# Altium schematic symbol library Connector.SchLib: 394 symbols (part 3 of 4) (continued)
## DIN-6
designator *  value DIN-6  Reference: J
6-pin DIN connector; ki_keywords: circular DIN connector; ki_fp_filters: DIN*; Datasheet: http://www.mouser.com/ds/2/18/40_c091_abd_e-75918.pdf; Description_: 6-pin DIN connector
pins: 1, 2, 3, 4, 5, 6

## DIN-7
designator *  value DIN-7  Reference: J
7-pin DIN connector; ki_keywords: circular DIN connector; ki_fp_filters: DIN*; Datasheet: http://www.mouser.com/ds/2/18/40_c091_abd_e-75918.pdf; Description_: 7-pin DIN connector
pins: 1, 2, 3, 4, 5, 6, 7

## DIN-7_CenterPin7
designator *  value DIN-7_CenterPin7  Reference: J
7-pin DIN connector with pin 7 in center; ki_keywords: circular DIN connector; ki_fp_filters: DIN*; Datasheet: http://www.mouser.com/ds/2/18/40_c091_abd_e-75918.pdf; Description_: 7-pin DIN connector with pin 7 in center
pins: 1, 2, 3, 4, 5, 6, 7

## DIN-8
designator *  value DIN-8  Reference: J
8-pin DIN connector; ki_keywords: circular DIN connector; ki_fp_filters: DIN*; Datasheet: http://www.mouser.com/ds/2/18/40_c091_abd_e-75918.pdf; Description_: 8-pin DIN connector
pins: 1, 2, 3, 4, 5, 6, 7, 8

## DVI-D_Dual_Link
designator *  value DVI-D_Dual_Link  Reference: J
DVI-D dual link connector; ki_keywords: dvi digital visual interface; ki_fp_filters: DVI-D*; Datasheet: https://www.molex.com/content/dam/molex/molex-dot-com/products/automated/en-us/salesdrawingpdf/743/74320/743204004_sd.pdf?inline; Description_: DVI-D dual link connector
pins: 1 D2-, 2 D2+, 3 D2/4S, 4 D4-, 5 D4+, 6 DDCCL, 7 DDCIO, 8 NC hidden, 9 D1-, 10 D1+, 11 D1/3S, 12 D3-, 13 D3+, 14 +5V, 15 GND, 16 HPD, 17 D0-, 18 D0+, 19 D0/5S, 20 D5-, 21 D5+, 22 CKS, 23 CK+, 24 CK-, SH
text: DVI-D; Dual Link

## DVI-I_Dual_Link
designator *  value DVI-I_Dual_Link  Reference: J
DVI-I dual link connector; ki_keywords: dvi digital visual interface; ki_fp_filters: DVI-I*; Datasheet: https://www.molex.com/content/dam/molex/molex-dot-com/products/automated/en-us/salesdrawingpdf/743/74320/743201004_sd.pdf?inline; Description_: DVI-I dual link connector
pins: 1 D2-, 2 D2+, 3 D2/4S, 4 D4-, 5 D4+, 6 DDCCL, 7 DDCIO, 8 VSYNC, 9 D1-, 10 D1+, 11 D1/3S, 12 D3-, 13 D3+, 14 +5V, 15 GND, 16 HPD, 17 D0-, 18 D0+, 19 D0/5S, 20 D5-, 21 D5+, 22 CKS, 23 CK+, 24 CK-, C1 Red, C2 Green, C3 Blue, C4 HSYNC, C5 GNDA, SH
text: DVI-I; Dual Link

## ExpressCard
designator *  value ExpressCard  Reference: J
ExpressCard connector; ki_keywords: expresscard pci express; ki_fp_filters: ExpressCard*; Datasheet: https://web.archive.org/web/20180809060653/http://www.usb.org/developers/expresscard/EC_specifications/ExpressCard_2_0_FINAL.pdf; Description_: ExpressCard connector
pins: 1 GND, 2 USBD-, 3 USBD+, 4 ~{{CPUSB}}, 5 ~{{USB3}}, 6 RESERVED, 7 SMBCLK, 8 SMDDATA, 9 1V5, 10 1V5, 11 ~{{WAKE}}, 12 3V3_AUX, 13 ~{{PERST}}, 14 3V3, 15 3V3, 16 ~{{CLKREQ}}, 17 ~{{CPPE}}, 18 REFCLK-, 19 REFCLK+, 20 GND hidden, 21 PERn0/SSRX-, 22 PERp0/SSRX+, 23 GND hidden, 24 PETn0/SSTX-, 25 PETp0/SSTX+, 26 GND hidden

## HDMI_A
designator *  value HDMI_A  Reference: J
HDMI type A connector; ki_keywords: hdmi conn; ki_fp_filters: HDMI*A*; Datasheet: https://en.wikipedia.org/wiki/HDMI; Description_: HDMI type A connector
pins: 1 D2+, 2 D2S, 3 D2-, 4 D1+, 5 D1S, 6 D1-, 7 D0+, 8 D0S, 9 D0-, 10 CK+, 11 CKS, 12 CK-, 13 CEC, 14 UTILITY, 15 SCL, 16 SDA, 17 GND, 18 +5V, 19 HPD, SH

## HDMI_A_1.4
designator *  value HDMI_A_1.4  Reference: J
HDMI 1.4+ type A connector; ki_keywords: hdmi conn; ki_fp_filters: HDMI*A*; Datasheet: https://en.wikipedia.org/wiki/HDMI; Description_: HDMI 1.4+ type A connector
pins: 1 D2+, 2 D2S, 3 D2-, 4 D1+, 5 D1S, 6 D1-, 7 D0+, 8 D0S, 9 D0-, 10 CK+, 11 CKS, 12 CK-, 13 CEC, 14 UTILITY/HEAC+, 15 SCL, 16 SDA, 17 GND, 18 +5V, 19 HPD/HEAC-, SH

## HDMI_B
designator *  value HDMI_B  Reference: J
HDMI type B connector; ki_keywords: hdmi conn; ki_fp_filters: HDMI*B*; Datasheet: http://pinouts.ru/Video/hdmi_pinout.shtml; Description_: HDMI type B connector
pins: 1 D2+, 2 D2S, 3 D2-, 4 D1+, 5 D1S, 6 D1-, 7 D0+, 8 D0S, 9 D0-, 10 CK+, 11 CKS, 12 CK-, 13 D5+, 14 D5S, 15 D5-, 16 D4+, 17 D4S, 18 D4-, 19 D3+, 20 D3S, 21 D3-, 22 CEC, 23 NC hidden, 24 NC hidden, 25 SCL, 26 SDA, 27 GND, 28 +5V, 29 HPD, SH

## HDMI_C_1.3
designator *  value HDMI_C_1.3  Reference: J
HDMI 1.3+ type C connector; ki_keywords: hdmi conn; ki_fp_filters: HDMI*C*; Datasheet: http://pinoutguide.com/PortableDevices/mini_hdmi_pinout.shtml; Description_: HDMI 1.3+ type C connector
pins: 1 D2S, 2 D2+, 3 D2-, 4 D1S, 5 D1+, 6 D1-, 7 D0S, 8 D0+, 9 D0-, 10 CKS, 11 CK+, 12 CK-, 13 GND, 14 CEC, 15 SCL, 16 SDA, 17 UTILITY, 18 +5V, 19 HPD, SH

## HDMI_C_1.4
designator *  value HDMI_C_1.4  Reference: J
HDMI 1.4+ type C connector; ki_keywords: hdmi conn; ki_fp_filters: HDMI*C*; Datasheet: http://pinoutguide.com/PortableDevices/mini_hdmi_pinout.shtml; Description_: HDMI 1.4+ type C connector
pins: 1 D2S, 2 D2+, 3 D2-, 4 D1S, 5 D1+, 6 D1-, 7 D0S, 8 D0+, 9 D0-, 10 CKS, 11 CK+, 12 CK-, 13 GND, 14 CEC, 15 SCL, 16 SDA, 17 UTILITY/HEAC+, 18 +5V, 19 HPD/HEAC-, SH

## HDMI_D_1.4
designator *  value HDMI_D_1.4  Reference: J
HDMI 1.4+ type D connector; ki_keywords: hdmi conn; ki_fp_filters: HDMI*D*; Datasheet: http://pinoutguide.com/PortableDevices/micro_hdmi_type_d_pinout.shtml; Description_: HDMI 1.4+ type D connector
pins: 1 HPD/HEAC-, 2 UTILITY/HEAC+, 3 D2+, 4 D2S, 5 D2-, 6 D1+, 7 D1S, 8 D1-, 9 D0+, 10 D0S, 11 D0-, 12 CK+, 13 CKS, 14 CK-, 15 CEC, 16 GND, 17 SCL, 18 SDA, 19 +5V, SH

## HDMI_E
designator *  value HDMI_E  Reference: J
HDMI type E connector; ki_keywords: hdmi conn; ki_fp_filters: HDMI*E*; Datasheet: https://www.hdmi.org/manufacturer/specification.aspx; Description_: HDMI type E connector
pins: 1 D2+, 2 D2S, 3 D2-, 4 D1+, 5 D1S, 6 D1-, 7 D0+, 8 D0S, 9 D0-, 10 CK+, 11 CKS, 12 CK-, 13 CEC, 14 UTILITY, 15 SCL, 16 SDA, 17 GND, 18 +5V, 19 HPD, SH

## IEC61076-2_M8_A-coding_01x03_Plug_Shielded
designator *  value IEC61076-2_M8_A-coding_01x03_Plug_Shielded  Reference: J
IEC 61076-2 3 ways shielded M8 A-coding plug connector; ki_fp_filters: *M8*03*; Description_: IEC 61076-2 3 ways shielded M8 A-coding plug connector; ki_keywords: M8
pins: 1, 3, 4, SH

## IEC61076-2_M8_A-coding_01x03_Receptacle_Shielded
designator *  value IEC61076-2_M8_A-coding_01x03_Receptacle_Shielded  Reference: J
IEC 61076-2 3 ways shielded M8 A-coding receptacle connector; ki_fp_filters: *M8*03*; Description_: IEC 61076-2 3 ways shielded M8 A-coding receptacle connector; ki_keywords: M8
pins: 1, 3, 4, SH

## IEC61076-2_M8_A-coding_01x04_Plug_Shielded
designator *  value IEC61076-2_M8_A-coding_01x04_Plug_Shielded  Reference: J
IEC 61076-2 4 ways shielded M8 A-coding plug connector; ki_keywords: M8 connector; ki_fp_filters: *M8*04*; Description_: IEC 61076-2 4 ways shielded M8 A-coding plug connector
pins: 1, 2, 3, 4, SH

## IEC61076-2_M8_A-coding_01x04_Receptacle_Shielded
designator *  value IEC61076-2_M8_A-coding_01x04_Receptacle_Shielded  Reference: J
IEC 61076-2 4 ways shielded M8 A-coding receptacle connector; ki_keywords: M8 connector; ki_fp_filters: *M8*04*; Description_: IEC 61076-2 4 ways shielded M8 A-coding receptacle connector
pins: 1, 2, 3, 4, SH

## IEC_60320_C5_Plug
designator *  value IEC_60320_C5_Plug  Reference: P
C5 Receptacle, 2,5 A max; ki_keywords: C5 IEC 60320; ki_fp_filters: C*5*Plug*; Datasheet: ~; Description_: C5 Receptacle, 2,5 A max
pins: 1 N, 2 L, 3 PE

## IEC_60320_C6_Receptacle
designator *  value IEC_60320_C6_Receptacle  Reference: J
C6 plug, 2,5A max; ki_keywords: IEC 60320 C6; ki_fp_filters: C*6*Receptacle*; Datasheet: ~; Description_: C6 plug, 2,5A max
pins: 1 L, 2 N, 3 PE

## IEC_60320_C7_Plug
designator *  value IEC_60320_C7_Plug  Reference: P
C7 coupler, 2,5 A max; ki_keywords: C7 Plug  IEC 60320; ki_fp_filters: C*7*Plug*; Datasheet: ~; Description_: C7 coupler, 2,5 A max
pins: 1 N, 2 L

## IEC_60320_C8_Receptacle
designator *  value IEC_60320_C8_Receptacle  Reference: J
C8 coupler, 2,5 A max; ki_keywords: C8 Receptacle  IEC 60320; ki_fp_filters: C*8*Receptacle*; Datasheet: ~; Description_: C8 coupler, 2,5 A max
pins: 1 L, 2 N

## IEC_60320_C13_Plug
designator *  value IEC_60320_C13_Plug  Reference: P
C13 Plug, 10A max; ki_keywords: Receptacle C13 IEC320; ki_fp_filters: C*13*Plug*; Datasheet: ~; Description_: C13 Plug, 10A max
pins: 1 N, 2 L, 3 PE

## IEC_60320_C14_Receptacle
designator *  value IEC_60320_C14_Receptacle  Reference: J
C14 Plug, 10A max; ki_keywords: Plug C14 IEC320; ki_fp_filters: C*14*Receptacle*; Datasheet: ~; Description_: C14 Plug, 10A max
pins: 1 L, 2 N, 3 PE

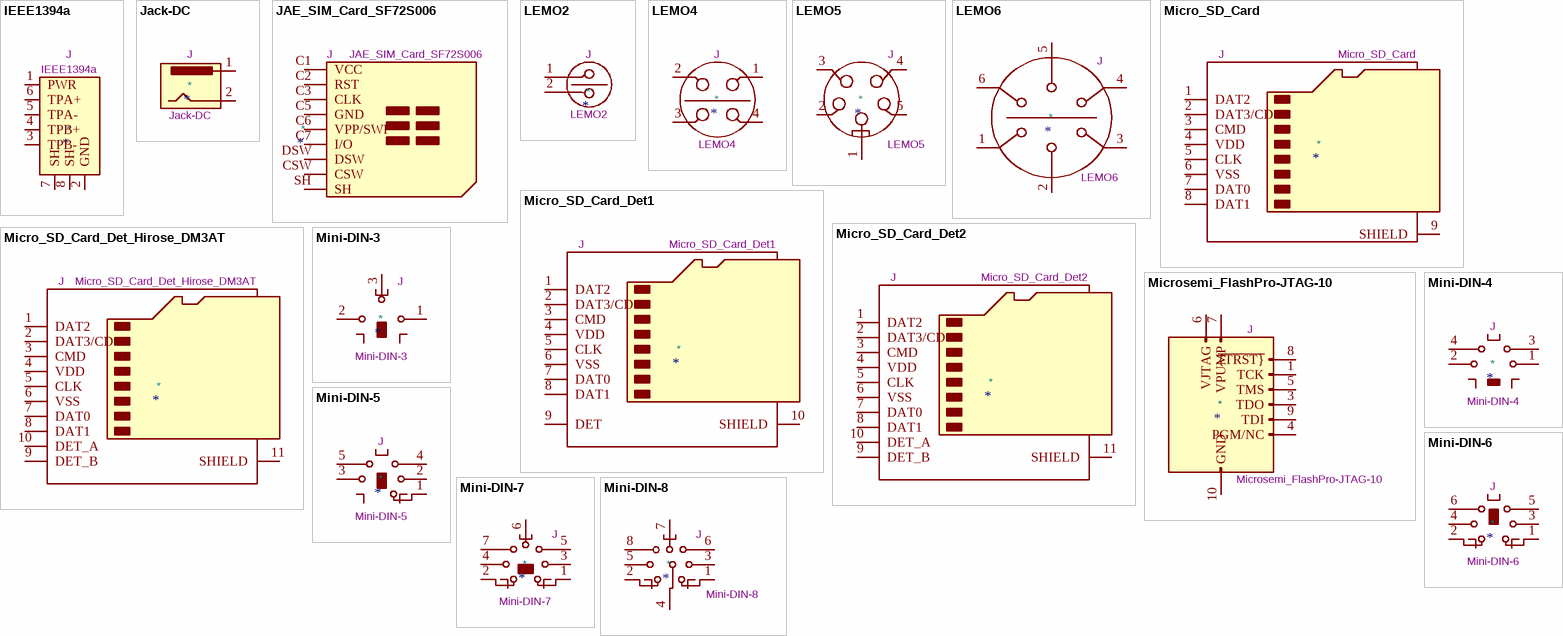
[diagram p11: symbols IEEE1394a to Mini-DIN-8]

## IEEE1394a
designator *  value IEEE1394a  Reference: J
FireWire/IEEE1394a 6-pin connector; ki_keywords: connector IEEE1394a FireWire; Datasheet: ~; Description_: FireWire/IEEE1394a 6-pin connector
pins: 1 PWR, 2 GND, 3 TPB-, 4 TPB+, 5 TPA-, 6 TPA+, 7 SH, 8 SH

## Jack-DC
designator *  value Jack-DC  Reference: J
DC Barrel Jack; ki_keywords: DC power barrel jack connector; ki_fp_filters: BarrelJack*; Datasheet: ~; Description_: DC Barrel Jack
pins: 1, 2

## JAE_SIM_Card_SF72S006
designator *  value JAE_SIM_Card_SF72S006  Reference: J
Nano-SIM Card (4FF) connector with Detect Switch; ki_keywords: SIM card UICC 4FF; ki_fp_filters: JAE*SIM*Card*SF72S006*; Footprint: Connector_JAE:JAE_SIM_Card_SF72S006; Datasheet: https://www.jae.com/direct/topics/topics_file_download/topics_id=68892&ext_no=06&index=0&_lang=en&v=202003111511468456809; Description_: Nano-SIM Card (4FF) connector with Detect Switch
pins: C1 VCC, C2 RST, C3 CLK, C5 GND, C6 VPP/SWP, C7 I/O, CSW, DSW, SH

## LEMO2
designator *  value LEMO2  Reference: J
2-pin LEMO connector; Datasheet: ~; Description_: 2-pin LEMO connector; ki_keywords: LEMO connector
pins: 1, 2

## LEMO4
designator *  value LEMO4  Reference: J
4-pin LEMO connector; Datasheet: ~; Description_: 4-pin LEMO connector; ki_keywords: LEMO connector
pins: 1, 2, 3, 4

## LEMO5
designator *  value LEMO5  Reference: J
5-pin LEMO connector; Datasheet: ~; Description_: 5-pin LEMO connector; ki_keywords: LEMO connector
pins: 1, 2, 3, 4, 5

## LEMO6
designator *  value LEMO6  Reference: J
6-pin LEMO connector; Datasheet: ~; Description_: 6-pin LEMO connector; ki_keywords: LEMO connector
pins: 1, 2, 3, 4, 5, 6

## Micro_SD_Card
designator *  value Micro_SD_Card  Reference: J
Micro SD Card Socket; ki_keywords: connector SD microsd; ki_fp_filters: microSD*; Datasheet: https://www.we-online.com/components/products/datasheet/693072010801.pdf; Description_: Micro SD Card Socket
pins: 1 DAT2, 2 DAT3/CD, 3 CMD, 4 VDD, 5 CLK, 6 VSS, 7 DAT0, 8 DAT1, 9 SHIELD

## Micro_SD_Card_Det1
designator *  value Micro_SD_Card_Det1  Reference: J
Micro SD Card Socket with one card detection pin; ki_keywords: connector SD microsd; ki_fp_filters: microSD*; Datasheet: https://datasheet.lcsc.com/lcsc/2110151630_XKB-Connectivity-XKTF-015-N_C381082.pdf; Description_: Micro SD Card Socket with one card detection pin
pins: 1 DAT2, 2 DAT3/CD, 3 CMD, 4 VDD, 5 CLK, 6 VSS, 7 DAT0, 8 DAT1, 9 DET, 10 SHIELD

## Micro_SD_Card_Det2
designator *  value Micro_SD_Card_Det2  Reference: J
Micro SD Card Socket with two card detection pins; ki_keywords: connector SD microsd; ki_fp_filters: microSD*; Datasheet: https://www.hirose.com/en/product/document?clcode=&productname=&series=DM3&documenttype=Catalog&lang=en&documentid=D49662_en; Description_: Micro SD Card Socket with two card detection pins
pins: 1 DAT2, 2 DAT3/CD, 3 CMD, 4 VDD, 5 CLK, 6 VSS, 7 DAT0, 8 DAT1, 9 DET_B, 10 DET_A, 11 SHIELD

## Micro_SD_Card_Det_Hirose_DM3AT
designator *  value Micro_SD_Card_Det_Hirose_DM3AT  Reference: J
Micro SD Card Socket with card detection pins; ki_keywords: connector SD microsd; ki_fp_filters: microSD*; Datasheet: https://www.hirose.com/product/en/download_file/key_name/DM3/category/Catalog/doc_file_id/49662/?file_category_id=4&item_id=195&is_series=1; Description_: Micro SD Card Socket with card detection pins
pins: 1 DAT2, 2 DAT3/CD, 3 CMD, 4 VDD, 5 CLK, 6 VSS, 7 DAT0, 8 DAT1, 9 DET_B, 10 DET_A, 11 SHIELD

## Microsemi_FlashPro-JTAG-10
designator *  value Microsemi_FlashPro-JTAG-10  Reference: J
ACTEL FLASH PRO 3/4, JTAG, IDC10 Pinheader Connector; ki_keywords: JTAG IDC10 Pinheader Pins Connector; ki_fp_filters: IDC?Header*2x05* Pin?Header*2x05*; Datasheet: https://www.microsemi.com/document-portal/doc_view/129973-lpf-ac386-an; Description_: ACTEL FLASH PRO 3/4, JTAG, IDC10 Pinheader Connector
pins: 1 TCK, 2 GND hidden, 3 TDO, 4 PGM/NC, 5 TMS, 6 VJTAG, 7 VPUMP, 8 ~{{TRST}}, 9 TDI, 10 GND

## Mini-DIN-3
designator *  value Mini-DIN-3  Reference: J
3-pin Mini-DIN connector; ki_fp_filters: MINI?DIN*; Datasheet: http://www.assmann-wsw.com/fileadmin/catalogue/10_MiniDIN_rev4-0.pdf; Description_: 3-pin Mini-DIN connector; ki_keywords: Mini-DIN
pins: 1, 2, 3

## Mini-DIN-4
designator *  value Mini-DIN-4  Reference: J
4-pin Mini-DIN connector; ki_fp_filters: MINI?DIN*; Datasheet: http://service.powerdynamics.com/ec/Catalog17/Section%2011.pdf; Description_: 4-pin Mini-DIN connector; ki_keywords: Mini-DIN
pins: 1, 2, 3, 4

## Mini-DIN-5
designator *  value Mini-DIN-5  Reference: J
5-pin Mini-DIN connector; ki_fp_filters: MINI?DIN*; Datasheet: http://service.powerdynamics.com/ec/Catalog17/Section%2011.pdf; Description_: 5-pin Mini-DIN connector; ki_keywords: Mini-DIN
pins: 1, 2, 3, 4, 5

## Mini-DIN-6
designator *  value Mini-DIN-6  Reference: J
6-pin Mini-DIN connector; ki_fp_filters: MINI?DIN*; Datasheet: http://service.powerdynamics.com/ec/Catalog17/Section%2011.pdf; Description_: 6-pin Mini-DIN connector; ki_keywords: Mini-DIN
pins: 1, 2, 3, 4, 5, 6

## Mini-DIN-7
designator *  value Mini-DIN-7  Reference: J
7-pin Mini-DIN connector; ki_fp_filters: MINI?DIN*; Datasheet: http://service.powerdynamics.com/ec/Catalog17/Section%2011.pdf; Description_: 7-pin Mini-DIN connector; ki_keywords: Mini-DIN
pins: 1, 2, 3, 4, 5, 6, 7

## Mini-DIN-8
designator *  value Mini-DIN-8  Reference: J
8-pin Mini-DIN connector; ki_fp_filters: MINI?DIN*; Datasheet: http://service.powerdynamics.com/ec/Catalog17/Section%2011.pdf; Description_: 8-pin Mini-DIN connector; ki_keywords: Mini-DIN
pins: 1, 2, 3, 4, 5, 6, 7, 8

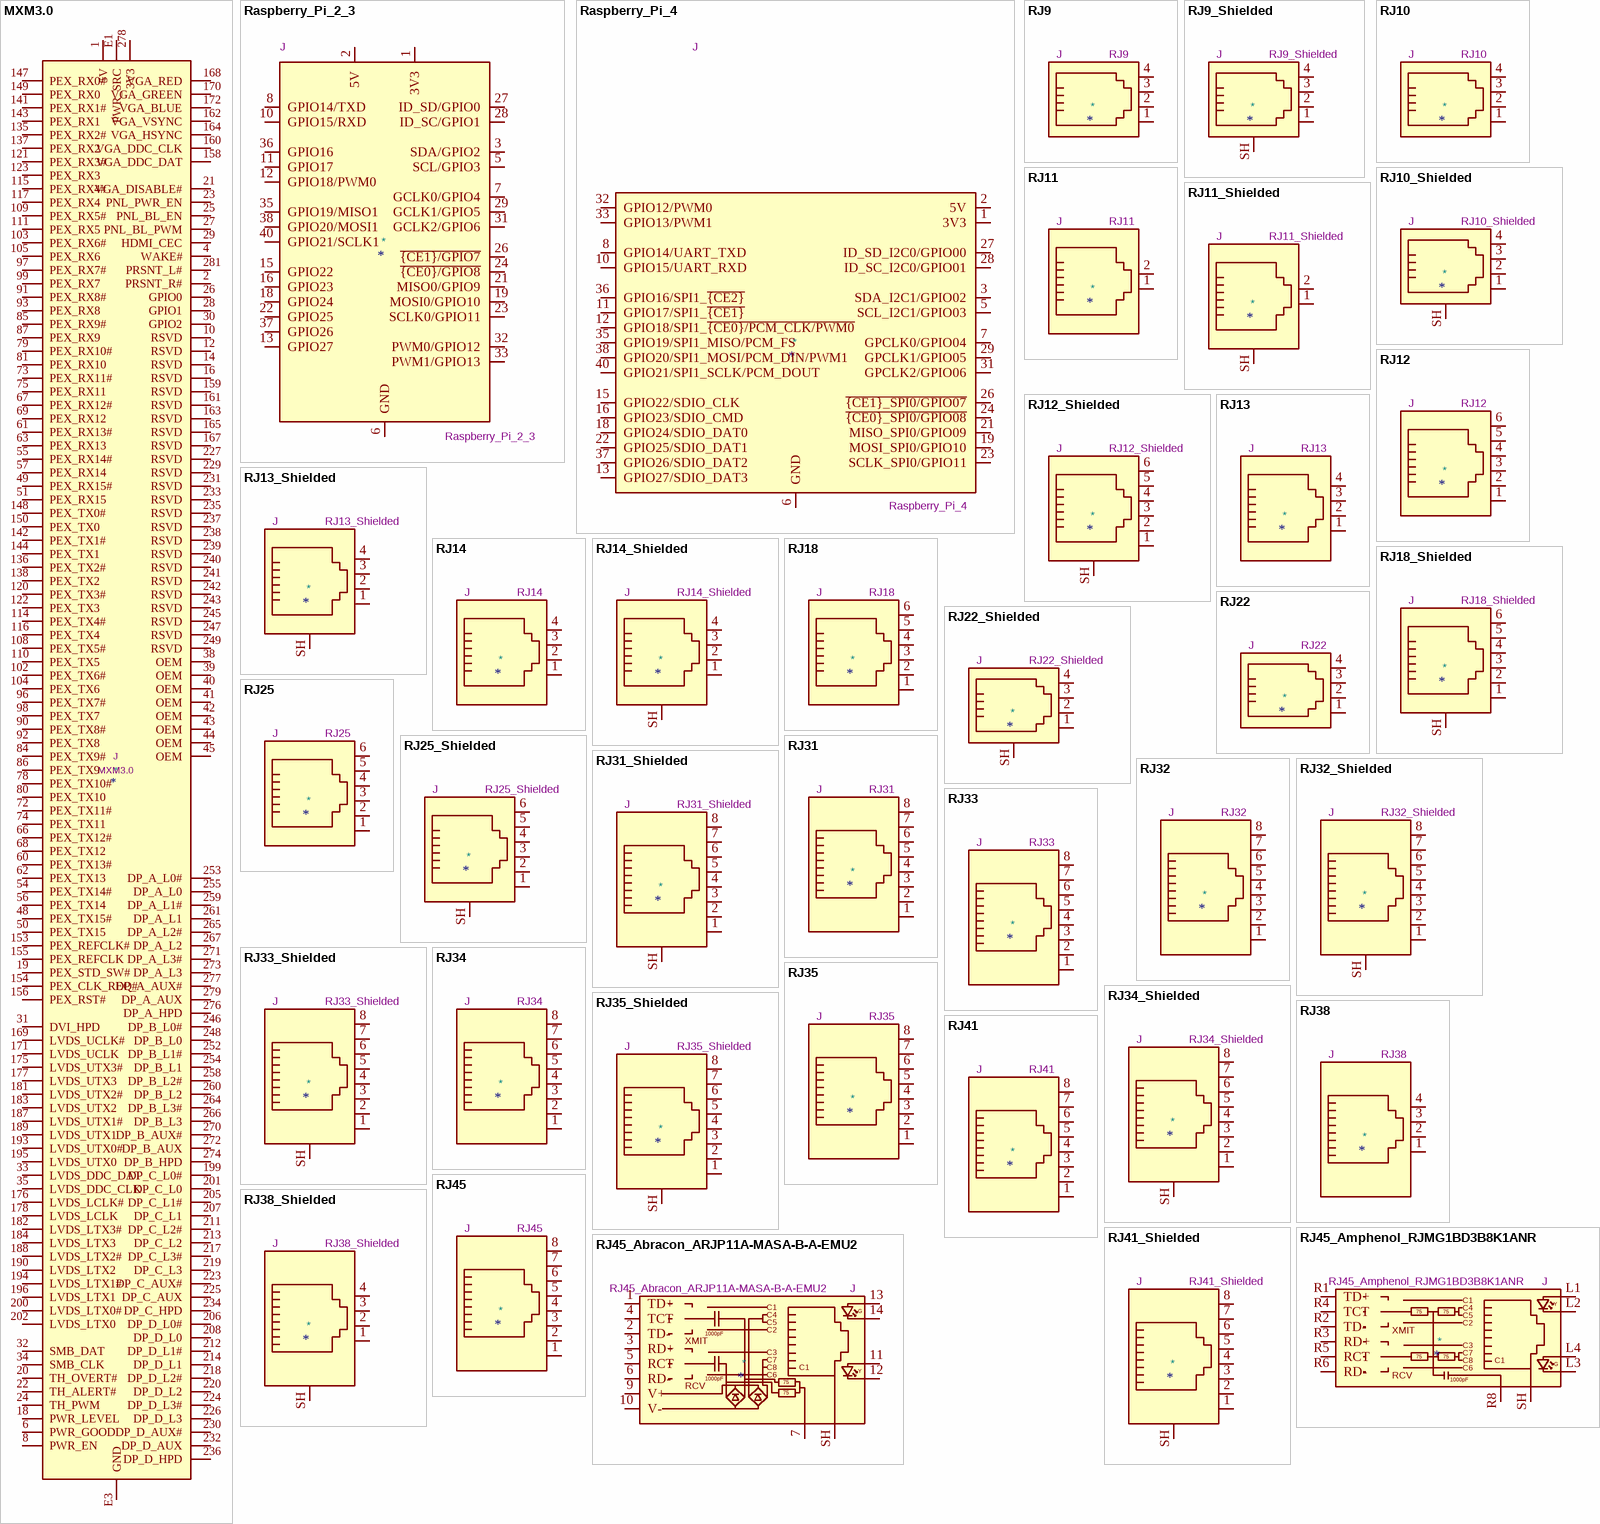
[diagram p12: symbols MXM3.0 to RJ45_Amphenol_RJMG1BD3B8K1ANR]

## MXM3.0
designator *  value MXM3.0  Reference: J
MXM3.0 connector; ki_keywords: MXM connector; ki_fp_filters: *MM70*; Datasheet: ~; Description_: MXM3.0 connector
pins: 1 5V, 2 PRSNT_R#, 3 5V hidden, 4 WAKE#, 5 5V hidden, 6 PWR_GOOD, 7 5V hidden, 8 PWR_EN, 9 5V hidden, 10 RSVD, 11 GND hidden, 12 RSVD, 13 GND hidden, 14 RSVD, 15 GND hidden, 16 RSVD, 17 GND hidden, 18 PWR_LEVEL, 19 PEX_STD_SW#, 20 TH_OVERT#, 21 VGA_DISABLE#, 22 TH_ALERT#, 23 PNL_PWR_EN, 24 TH_PWM, 25 PNL_BL_EN, 26 GPIO0, 27 PNL_BL_PWM, 28 GPIO1, 29 HDMI_CEC, 30 GPIO2, 31 DVI_HPD, 32 SMB_DAT, 33 LVDS_DDC_DAT, 34 SMB_CLK, 35 LVDS_DDC_CLK, 36 GND hidden, 37 GND hidden, 38 OEM, 39 OEM, 40 OEM, 41 OEM, 42 OEM, 43 OEM, 44 OEM, 45 OEM, 46 GND hidden, 47 GND hidden, 48 PEX_TX15#, 49 PEX_RX15#, 50 PEX_TX15, 51 PEX_RX15, 52 GND hidden, 53 GND hidden, 54 PEX_TX14#, 55 PEX_RX14#, 56 PEX_TX14, 57 PEX_RX14, 58 GND hidden, 59 GND hidden, 60 PEX_TX13#, 61 PEX_RX13#, 62 PEX_TX13, 63 PEX_RX13, 64 GND hidden, 65 GND hidden, 66 PEX_TX12#, 67 PEX_RX12#, 68 PEX_TX12, 69 PEX_RX12, 70 GND hidden, 71 GND hidden, 72 PEX_TX11#, 73 PEX_RX11#, 74 PEX_TX11, 75 PEX_RX11, 76 GND hidden, 77 GND hidden, 78 PEX_TX10#, 79 PEX_RX10#, 80 PEX_TX10, 81 PEX_RX10, 82 GND hidden, 83 GND hidden, 84 PEX_TX9#, 85 PEX_RX9#, 86 PEX_TX9, 87 PEX_RX9, 88 GND hidden, 89 GND hidden, 90 PEX_TX8#, 91 PEX_RX8#, 92 PEX_TX8, 93 PEX_RX8, 94 GND hidden, 95 GND hidden, 96 PEX_TX7#, 97 PEX_RX7#, 98 PEX_TX7, 99 PEX_RX7, 100 GND hidden, 101 GND hidden, 102 PEX_TX6#, 103 PEX_RX6#, 104 PEX_TX6, 105 PEX_RX6, 106 GND hidden, 107 GND hidden, 108 PEX_TX5#, 109 PEX_RX5#, 110 PEX_TX5, 111 PEX_RX5, 112 GND hidden, 113 GND hidden, 114 PEX_TX4#, 115 PEX_RX4#, 116 PEX_TX4, 117 PEX_RX4, 118 GND hidden, 119 GND hidden, 120 PEX_TX3#, 121 PEX_RX3#, 122 PEX_TX3, 123 PEX_RX3, 124 GND hidden, 125 GND hidden, 133 GND hidden, 134 GND hidden, 135 PEX_RX2#, 136 PEX_TX2#, 137 PEX_RX2, 138 PEX_TX2, 139 GND hidden, 140 GND hidden, 141 PEX_RX1#, 142 PEX_TX1#, 143 PEX_RX1, 144 PEX_TX1, 145 GND hidden, 146 GND hidden, 147 PEX_RX0#, 148 PEX_TX0#, 149 PEX_RX0, 150 PEX_TX0, 151 GND hidden, 152 GND hidden, 153 PEX_REFCLK#, 154 PEX_CLK_REQ#, 155 PEX_REFCLK, 156 PEX_RST#, 157 GND hidden, 158 VGA_DDC_DAT, 159 RSVD, 160 VGA_DDC_CLK, 161 RSVD, 162 VGA_VSYNC, 163 RSVD, 164 VGA_HSYNC, 165 RSVD, 166 GND hidden, 167 RSVD, 168 VGA_RED, 169 LVDS_UCLK#, 170 VGA_GREEN, 171 LVDS_UCLK, 172 VGA_BLUE, 173 GND hidden, 174 GND hidden, 175 LVDS_UTX3#, 176 LVDS_LCLK#, 177 LVDS_UTX3, 178 LVDS_LCLK, 179 GND hidden, 180 GND hidden, 181 LVDS_UTX2#, 182 LVDS_LTX3#, 183 LVDS_UTX2, 184 LVDS_LTX3, 185 GND hidden, 186 GND hidden, 187 LVDS_UTX1#, 188 LVDS_LTX2#, 189 LVDS_UTX1, 190 LVDS_LTX2, 191 GND hidden, 192 GND hidden, 193 LVDS_UTX0#, 194 LVDS_LTX1#, 195 LVDS_UTX0, 196 LVDS_LTX1, 197 GND hidden, 198 GND hidden, 199 DP_C_L0#, 200 LVDS_LTX0#, 201 DP_C_L0, 202 LVDS_LTX0, 203 GND hidden, 204 GND hidden, 205 DP_C_L1#, 206 DP_D_L0#, 207 DP_C_L1, 208 DP_D_L0, 209 GND hidden, 210 GND hidden, 211 DP_C_L2#, 212 DP_D_L1#, 213 DP_C_L2, 214 DP_D_L1, 215 GND hidden, 216 GND hidden, 217 DP_C_L3#, 218 DP_D_L2#, 219 DP_C_L3, 220 DP_D_L2, 221 GND hidden, 222 GND hidden, 223 DP_C_AUX#, 224 DP_D_L3#, 225 DP_C_AUX, 226 DP_D_L3, 227 RSVD, 228 GND hidden, 229 RSVD, 230 DP_D_AUX#, 231 RSVD, 232 DP_D_AUX, 233 RSVD, 234 DP_C_HPD, 235 RSVD, 236 DP_D_HPD, 237 RSVD, 238 RSVD, 239 RSVD, 240 RSVD, 241 RSVD, 242 RSVD, 243 RSVD, 244 GND hidden, 245 RSVD, 246 DP_B_L0#, 247 RSVD, 248 DP_B_L0, 249 RSVD, 250 GND hidden, 251 GND hidden, 252 DP_B_L1#, 253 DP_A_L0#, 254 DP_B_L1, 255 DP_A_L0, 256 GND hidden, 257 GND hidden, 258 DP_B_L2#, 259 DP_A_L1#, 260 DP_B_L2, 261 DP_A_L1, 262 GND hidden, 263 GND hidden, 264 DP_B_L3#, 265 DP_A_L2#, 266 DP_B_L3, 267 DP_A_L2, 268 GND hidden, 269 GND hidden, 270 DP_B_AUX#, 271 DP_A_L3#, 272 DP_B_AUX, 273 DP_A_L3, 274 DP_B_HPD, 275 GND hidden, 276 DP_A_HPD, 277 DP_A_AUX#, 278 3V3, 279 DP_A_AUX, 280 3V3 hidden, 281 PRSNT_L#, E1 PWR_SRC, E2 PWR_SRC hidden, E3 GND, E4 GND hidden